# Altium footprint library ABSDataSystem_PartsLibrary.PcbLib: 50 footprints (part 2 of 4)
Each footprint in its own frame and in the unit in brackets; x right, y up, seen from the top. Pads: shape width x height; smd on the part's side, far side on the other; paste and mask are expansions set on the pad; w line width, h text height; cw(c..) or ccw(c..) is an arc to the next point about the centre after c.
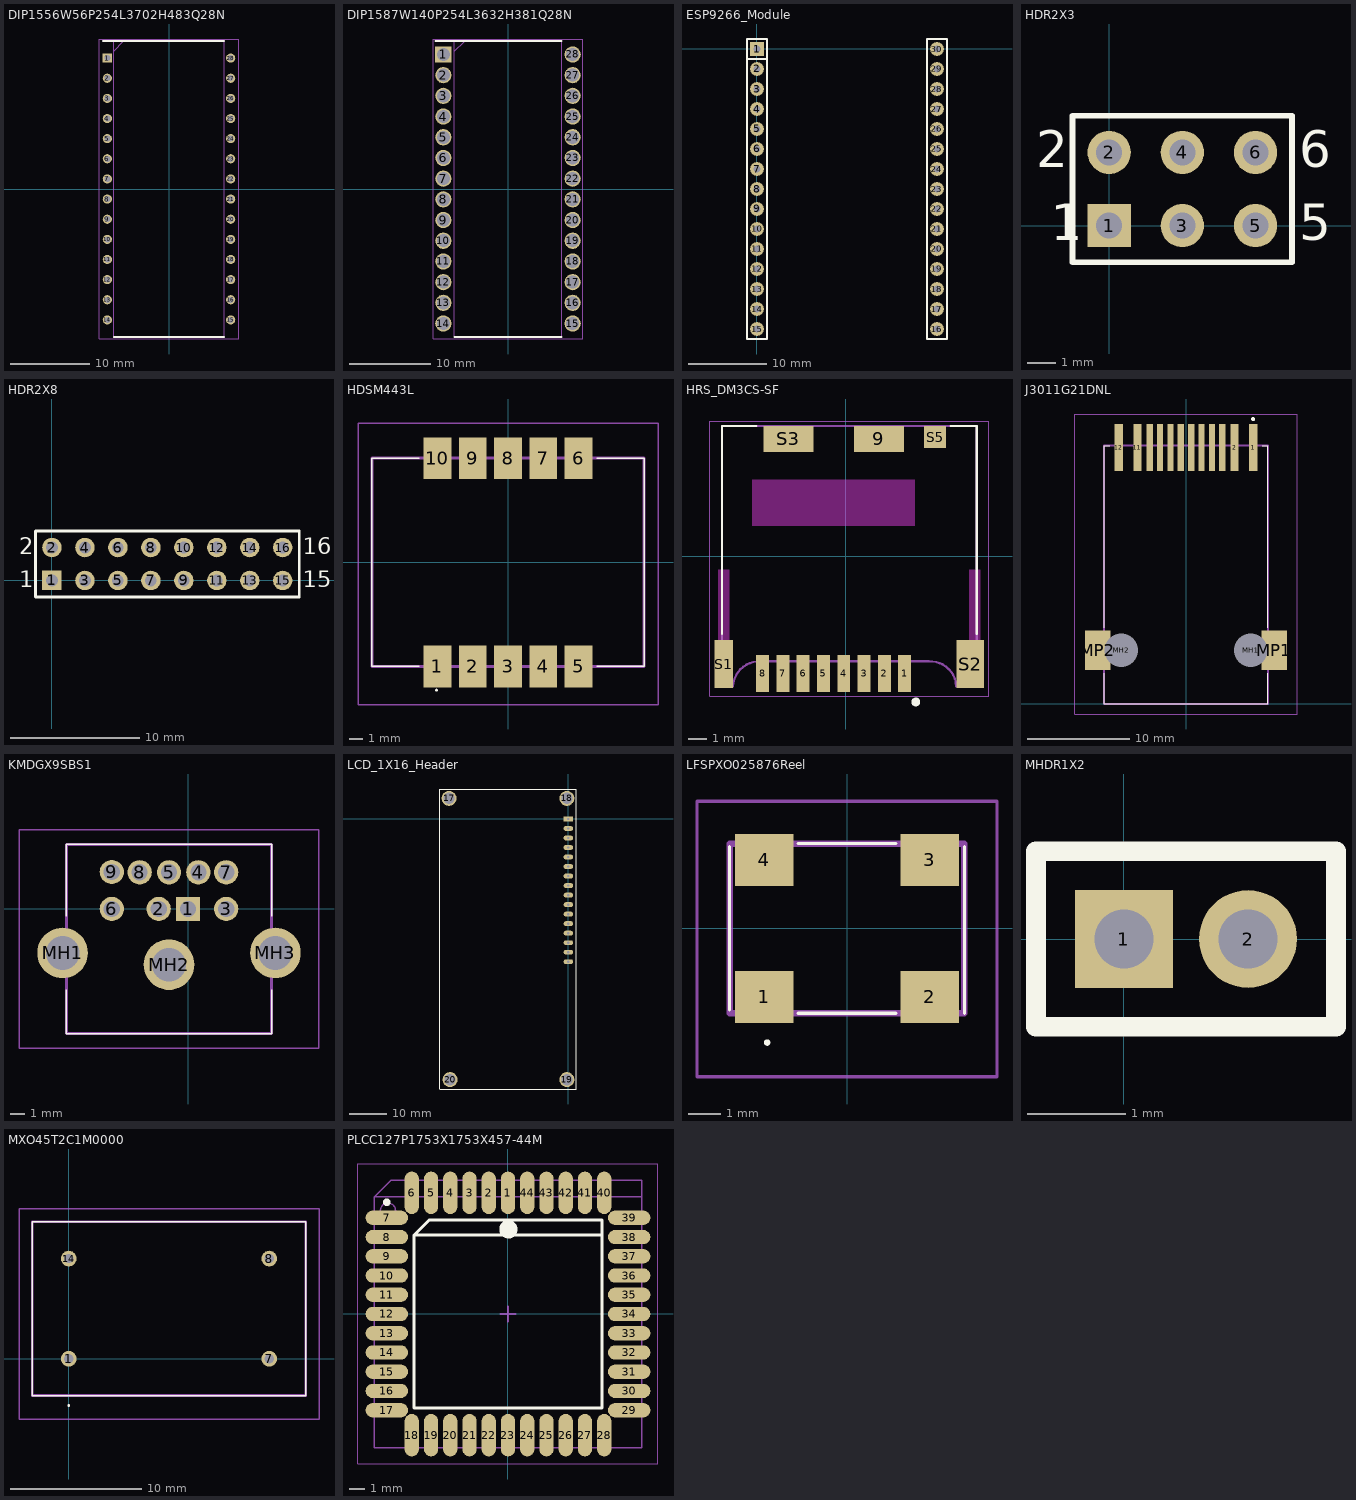
[diagram p1: the footprints below, top view; thin cyan lines are the x and y axes]

## DIP1556W56P254L3702H483Q28N [mm]
pads (28):
  rect 1.159x1.159 hole 0.759: 1(-7.779,16.51)
  round 1.159 hole 0.759: 2(-7.779,13.97) 3(-7.779,11.43) 4(-7.779,8.89) 5(-7.779,6.35) 6(-7.779,3.81) 7(-7.779,1.27) 8(-7.779,-1.27) 9(-7.779,-3.81) 10(-7.779,-6.35) 11(-7.779,-8.89) 12(-7.779,-11.43) 13(-7.779,-13.97) 14(-7.779,-16.51) 15(7.779,-16.51) 16(7.779,-13.97) 17(7.779,-11.43) 18(7.779,-8.89) 19(7.779,-6.35) 20(7.779,-3.81) 21(7.779,-1.27) 22(7.779,1.27) 23(7.779,3.81) 24(7.779,6.35) 25(7.779,8.89) 26(7.779,11.43) 27(7.779,13.97) 28(7.779,16.51)
Top Overlay:
  lines w0.2: -8.358,18.669 6.985,18.669 ; -6.985,-18.669 6.985,-18.669
Mechanical 13:
  lines w0.1: -6.985,17.399 -5.715,18.669 ; -6.985,-18.669 -6.985,18.669 6.985,18.669 6.985,-18.669 -6.985,-18.669
Mechanical 15:
  lines w0.05: -8.767,-18.919 -8.767,18.919 8.767,18.919 8.767,-18.919 -8.767,-18.919
3D body "AT28C256-15PU.stp": height 4.83, standoff -3.5, extent -7.919,-18.51 7.919,18.51

## DIP1587W140P254L3632H381Q28N [mm]
pads (28):
  rect 1.997x1.997 hole 1.597: 1(-7.935,16.51)
  round 1.997 hole 1.597: 2(-7.935,13.97) 3(-7.935,11.43) 4(-7.935,8.89) 5(-7.935,6.35) 6(-7.935,3.81) 7(-7.935,1.27) 8(-7.935,-1.27) 9(-7.935,-3.81) 10(-7.935,-6.35) 11(-7.935,-8.89) 12(-7.935,-11.43) 13(-7.935,-13.97) 14(-7.935,-16.51) 15(7.935,-16.51) 16(7.935,-13.97) 17(7.935,-11.43) 18(7.935,-8.89) 19(7.935,-6.35) 20(7.935,-3.81) 21(7.935,-1.27) 22(7.935,1.27) 23(7.935,3.81) 24(7.935,6.35) 25(7.935,8.89) 26(7.935,11.43) 27(7.935,13.97) 28(7.935,16.51)
Top Overlay:
  lines w0.2: -8.934,18.161 6.604,18.161 ; -6.604,-18.161 6.604,-18.161
Mechanical 13:
  lines w0.1: -6.604,16.891 -5.334,18.161 ; -6.604,-18.161 -6.604,18.161 6.604,18.161 6.604,-18.161 -6.604,-18.161
Mechanical 15:
  lines w0.05: -9.184,-18.411 -9.184,18.411 9.184,18.411 9.184,-18.411 -9.184,-18.411
3D body "AS6C62256-55PCN.stp": height 3.81, standoff -3.5, extent -8.284,-18.161 8.284,18.161

## ESP9266_Module [mil]
pads (30):
  rect 69x69 hole 35: 1(0,0)
  round 69 hole 35: 2(0,-100) 3(0,-200) 4(0,-300) 5(0,-400) 6(0,-500) 7(0,-600) 8(0,-700) 9(0,-800) 10(0,-900) 11(0,-1000) 12(0,-1100) 13(0,-1200) 14(0,-1300) 15(0,-1400) 16(900,-1400) 17(900,-1300) 18(900,-1200) 19(900,-1100) 20(900,-1000) 21(900,-900) 22(900,-800) 23(900,-700) 24(900,-600) 25(900,-500) 26(900,-400) 27(900,-300) 28(900,-200) 29(900,-100) 30(900,0)
Top Overlay:
  lines w7.87: -50,-50 50,-50 ; -50,-1450 -50,50 50,50 50,-1450 -50,-1450 ; 850,-1450 850,50 950,50 950,-1450 850,-1450
3D body "User Library-Male-Pin Header Strip-1x1-2.54mm.step": height 335, standoff -145, extent 842.52,-750 957.48,-650
3D body "User Library-Male-Pin Header Strip-1x1-2.54mm.step": height 335, standoff -145, extent 842.52,-850 957.48,-750
3D body "User Library-Male-Pin Header Strip-1x1-2.54mm.step": height 335, standoff -145, extent 842.52,-950 957.48,-850
3D body "User Library-Male-Pin Header Strip-1x1-2.54mm.step": height 335, standoff -145, extent 842.52,-650 957.48,-550
3D body "User Library-Male-Pin Header Strip-1x1-2.54mm.step": height 335, standoff -145, extent 842.52,-550 957.48,-450
3D body "User Library-Male-Pin Header Strip-1x1-2.54mm.step": height 335, standoff -145, extent 842.52,-250 957.48,-150
3D body "User Library-Male-Pin Header Strip-1x1-2.54mm.step": height 335, standoff -145, extent 842.52,-350 957.48,-250
3D body "User Library-Male-Pin Header Strip-1x1-2.54mm.step": height 335, standoff -145, extent 842.52,-450 957.48,-350
3D body "User Library-Male-Pin Header Strip-1x1-2.54mm.step": height 335, standoff -145, extent 842.52,-150 957.48,-50
3D body "User Library-Male-Pin Header Strip-1x1-2.54mm.step": height 335, standoff -145, extent 842.52,-50 957.48,50
3D body "User Library-Male-Pin Header Strip-1x1-2.54mm.step": height 335, standoff -145, extent 842.52,-1050 957.48,-950
3D body "User Library-Male-Pin Header Strip-1x1-2.54mm.step": height 335, standoff -145, extent 842.52,-1350 957.48,-1250
3D body "User Library-Male-Pin Header Strip-1x1-2.54mm.step": height 335, standoff -145, extent 842.52,-1250 957.48,-1150
3D body "User Library-Male-Pin Header Strip-1x1-2.54mm.step": height 335, standoff -145, extent 842.52,-1150 957.48,-1050
3D body "User Library-Male-Pin Header Strip-1x1-2.54mm.step": height 335, standoff -145, extent 842.52,-1450 957.48,-1350
3D body "User Library-Male-Pin Header Strip-1x1-2.54mm.step": height 335, standoff -145, extent -57.48,-750 57.48,-650
3D body "User Library-Male-Pin Header Strip-1x1-2.54mm.step": height 335, standoff -145, extent -57.48,-850 57.48,-750
3D body "User Library-Male-Pin Header Strip-1x1-2.54mm.step": height 335, standoff -145, extent -57.48,-950 57.48,-850
3D body "User Library-Male-Pin Header Strip-1x1-2.54mm.step": height 335, standoff -145, extent -57.48,-650 57.48,-550
3D body "User Library-Male-Pin Header Strip-1x1-2.54mm.step": height 335, standoff -145, extent -57.48,-550 57.48,-450
3D body "User Library-Male-Pin Header Strip-1x1-2.54mm.step": height 335, standoff -145, extent -57.48,-250 57.48,-150
3D body "User Library-Male-Pin Header Strip-1x1-2.54mm.step": height 335, standoff -145, extent -57.48,-350 57.48,-250
3D body "User Library-Male-Pin Header Strip-1x1-2.54mm.step": height 335, standoff -145, extent -57.48,-450 57.48,-350
3D body "User Library-Male-Pin Header Strip-1x1-2.54mm.step": height 335, standoff -145, extent -57.48,-150 57.48,-50
3D body "User Library-Male-Pin Header Strip-1x1-2.54mm.step": height 335, standoff -145, extent -57.48,-50 57.48,50
3D body "User Library-Male-Pin Header Strip-1x1-2.54mm.step": height 335, standoff -145, extent -57.48,-1050 57.48,-950
3D body "User Library-Male-Pin Header Strip-1x1-2.54mm.step": height 335, standoff -145, extent -57.48,-1350 57.48,-1250
3D body "User Library-Male-Pin Header Strip-1x1-2.54mm.step": height 335, standoff -145, extent -57.48,-1250 57.48,-1150
3D body "User Library-Male-Pin Header Strip-1x1-2.54mm.step": height 335, standoff -145, extent -57.48,-1150 57.48,-1050
3D body "User Library-Male-Pin Header Strip-1x1-2.54mm.step": height 335, standoff -145, extent -57.48,-1450 57.48,-1350

## HDR2X3 [mm] "Connector; Header; 3x2 Position"
pads (6):
  rect 1.5x1.5 hole 0.9: 1(0,0)
  round 1.5 hole 0.9: 2(0,2.54) 3(2.54,0) 4(2.54,2.54) 5(5.08,0) 6(5.08,2.54)
Top Overlay:
  lines w0.2: 1.482,-1.27 6.35,-1.27 ; 6.35,-1.27 -1.27,-1.27 -1.27,3.81 6.35,3.81 6.35,-1.27
  text "1" at -2.032,-0.508 h1.27
  text "2" at -2.54,2.032 h1.27
  text "5" at 6.604,-0.508 h1.27
  text "6" at 6.604,2.032 h1.27

## HDR2X8 [mm] "Connector; Header; 8x2 Position"
pads (16):
  rect 1.5x1.5 hole 0.9: 1(0,0)
  round 1.5 hole 0.9: 2(0,2.54) 3(2.54,0) 4(2.54,2.54) 5(5.08,0) 6(5.08,2.54) 7(7.62,0) 8(7.62,2.54) 9(10.16,0) 10(10.16,2.54) 11(12.7,0) 12(12.7,2.54) 13(15.24,0) 14(15.24,2.54) 15(17.78,0) 16(17.78,2.54)
Top Overlay:
  lines w0.2: -1.27,-1.27 -1.27,3.81 19.05,3.81 19.05,-1.27 -1.27,-1.27
  text "2" at -2.54,2.032 h1.27
  text "1" at -2.54,-0.508 h1.27
  text "15" at 19.304,-0.508 h1.27
  text "16" at 19.304,2.032 h1.27

## HDSM443L [mm]
pads (10):
  rect 2x3 smd: 1(-5.08,-7.5) 2(-2.54,-7.5) 3(0,-7.5) 4(2.54,-7.5) 5(5.08,-7.5) 6(5.08,7.5) 7(2.54,7.5) 8(0,7.5) 9(-2.54,7.5) 10(-5.08,7.5)
Top Overlay:
  lines w0.1: -6.4,-7.5 -9.8,-7.5 -9.8,7.5 -6.4,7.5 ; 6.4,-7.5 9.8,-7.5 9.8,7.5 6.4,7.5 ; -5.2,-9.2 cw(c-5.15,-9.2) -5.1,-9.2 cw(c-5.15,-9.2) -5.2,-9.2
Mechanical 13:
  lines w0.2: -9.8,-7.5 -9.8,7.5 9.8,7.5 9.8,-7.5 -9.8,-7.5
Mechanical 15:
  lines w0.1: -10.8,-10.25 -10.8,10 10.8,10 10.8,-10.25 -10.8,-10.25
3D body "HDSM-443L.stp": height 4.1, standoff 0, extent -9.8,-8.8 9.8,8.8

## HRS_DM3CS-SF [mm]
pads (13):
  rect 0.7x2 smd: 1(3.2,-6.35) 2(2.1,-6.35) 3(1,-6.35) 4(-0.1,-6.35) 5(-1.2,-6.35) 6(-2.3,-6.35) 7(-3.4,-6.35) 8(-4.5,-6.35)
  rect 2.7x1.4 smd: 9(1.8,6.35) S3(-3.1,6.35)
  rect 1x2.6 smd: S1(-6.6,-5.85)
  rect 1.5x2.6 smd: S2(6.75,-5.85)
  rect 1.2x1.2 smd: S5(4.85,6.45)
Top Overlay:
  circle w0.24: c3.8,-7.9 r0.12
  lines w0.127: -6.7,-4.2 -6.7,7.05 -4.826,7.05 ; 5.7,7.05 7.1,7.05 7.1,-4.2
Keep-Out Layer:
  region: 7.3,-4.558 6.712,-4.558 6.712,-0.75 7.3,-0.75
  region: -6.3,-4.558 -6.912,-4.558 -6.912,-0.75 -6.3,-0.75
  region: 7.3,-4.556 6.709,-4.556 6.709,-0.75 7.3,-0.75
  region: -6.3,-4.558 -6.912,-4.558 -6.912,-0.75 -6.3,-0.75
  region: 3.75,1.651 -5.053,1.651 -5.053,4.15 3.75,4.15
  region: 3.75,1.65 -5.051,1.65 -5.051,4.15 3.75,4.15
Mechanical 13:
  lines w0.127: 4.5,-5.7 -4.6,-5.7 ccw(c-4.675,-7.125) -6.1,-7.05 -6.7,-7.05 -6.7,7.05 7.1,7.05 7.1,-7.05 6,-7.05 ccw(c4.575,-7.125) 4.5,-5.7
Mechanical 15:
  lines w0.05: -7.35,-7.6 7.75,-7.6 7.75,7.3 -7.35,7.3 -7.35,-7.6

## J3011G21DNL [mm]
pads (16):
  rect 0.81x4.6 smd: 1(6.61,25.2) 2(4.77,25.2) 11(-4.77,25.2) 12(-6.61,25.2)
  rect 0.61x4.6 smd: 3(3.57,25.2) 4(2.55,25.2) 5(1.53,25.2) 6(0.51,25.2) 7(-0.51,25.2) 8(-1.53,25.2) 9(-2.55,25.2) 10(-3.57,25.2)
  round 1.65 hole 3.3 unplated: MH1(6.35,5.28) MH2(-6.35,5.28)
  rect 2.5x3.9 smd: MP1(8.67,5.28) MP2(-8.67,5.28)
Top Overlay:
  lines w0.1: -8.05,3 -8.05,0 8,0 8.05,0 8.05,3 ; -8.05,7.5 -8.05,25.4 -7.5,25.4 ; 7.5,25.4 8.05,25.4 8.05,7.5
  lines w0.2: 6.5,28 ccw(c6.6,28) 6.7,28 ccw(c6.6,28) 6.5,28
Mechanical 13:
  lines w0.2: -8.05,0 8.05,0 8.05,25.4 -8.05,25.4 -8.05,0
Mechanical 15:
  lines w0.1: -10.92,-1 10.92,-1 10.92,28.5 -10.92,28.5 -10.92,-1

## KMDGX9SBS1 [mm]
pads (12):
  rect 1.65x1.65 hole 1.1: 1(0,0)
  round 1.65 hole 1.1: 2(-2,0) 3(2.6,0) 4(0.7,2.5) 5(-1.3,2.5) 6(-5.2,0) 7(2.6,2.5) 8(-3.3,2.5) 9(-5.2,2.52)
  round 3.45 hole 2.3: MH1(-8.55,-3) MH2(-1.3,-3.8) MH3(5.95,-3)
Top Overlay:
  lines w0.1: -8.3,-5.5 -8.3,-8.5 5.7,-8.5 5.7,-5.5 ; -8.3,-0.5 -8.3,4.4 5.7,4.4 5.7,-0.5
Mechanical 13:
  lines w0.2: -8.3,-8.5 5.7,-8.5 5.7,4.4 -8.3,4.4 -8.3,-8.5
Mechanical 15:
  lines w0.1: -11.525,-9.5 8.925,-9.5 8.925,5.4 -11.525,5.4 -11.525,-9.5
3D body "KMDGX-9S-BS-1.stp": height 13.1, standoff -5, extent -9.592,-8.5 7,4.4

## LCD_1X16_Header [mm]
pads (20):
  rect 2.54x1.27 hole 0.635: 1(0,0)
  oval 2.54x1.27 hole 0.635: 2(0,-2.54) 3(0,-5.08) 4(0,-7.62) 5(0,-10.16) 6(0,-12.7) 7(0,-15.24) 8(0,-17.78) 9(0,-20.32) 10(0,-22.86) 11(0,-25.4) 12(0,-27.94) 13(0,-30.48) 14(0,-33.02) 15(0,-35.56) 16(0,-38.1)
  round 4 hole 3: 17(-31.866,5.5) 18(-0.396,5.5) 19(-0.396,-69.6) 20(-31.572,-69.6)
Top Overlay:
  lines w0.254: -34.366,-72.1 2.134,-72.1 2.134,8 -34.366,8 -32.232,8 ; -34.366,-72.093 -34.366,0 -34.366,8.001

## LFSPXO025876Reel [mm]
pads (4):
  rect 1.8x1.6 smd: 1(-2.54,-2.1) 2(2.54,-2.1) 3(2.54,2.1) 4(-2.54,2.1)
Top Overlay:
  lines w0.1: -3.6,-2.5 -3.6,2.5 ; -1.5,-2.6 1.5,-2.6 ; -1.5,2.6 1.5,2.6 ; 3.6,-2.6 3.6,2.5 ; -2.5,-3.5 cw(c-2.45,-3.5) -2.4,-3.5 cw(c-2.45,-3.5) -2.5,-3.5
Mechanical 13:
  lines w0.2: -3.6,-2.6 -3.6,2.6 3.6,2.6 3.6,-2.6 -3.6,-2.6
Mechanical 15:
  lines w0.1: -4.6,-4.55 -4.6,3.9 4.6,3.9 4.6,-4.55 -4.6,-4.55
3D body "LFSPXO025876Reel.stp": height 1.5, standoff 0, extent -3.6,-2.74 3.6,2.74

## MHDR1X2 [mm] "Connector; Header; 2 Position"
pads (2):
  rect 1x1 hole 0.6: 1(0,0)
  round 1 hole 0.6: 2(1.27,0)
Top Overlay:
  lines w0.2: -0.9,-0.9 -0.9,0.9 2.17,0.9 2.17,-0.9 -0.9,-0.9

## MXO45T2C1M0000 [mm]
pads (4):
  round 1.192 hole 0.7: 1(0,0) 7(15.24,0) 8(15.24,7.62) 14(0,7.62)
Top Overlay:
  lines w0.1: -2.78,-2.79 18.02,-2.79 18.02,10.41 -2.78,10.41 -2.78,-2.79 ; 0,-3.6 cw(c0,-3.55) 0,-3.5 cw(c0,-3.55) 0,-3.6
Mechanical 13:
  lines w0.2: -2.78,-2.79 18.02,-2.79 18.02,10.41 -2.78,10.41 -2.78,-2.79
Mechanical 15:
  lines w0.1: -3.78,-4.6 19.02,-4.6 19.02,11.41 -3.78,11.41 -3.78,-4.6
3D body "MXO45T-2C-1M0000.stp": height 6.2, standoff -5, extent -2.78,-2.79 18.02,10.41

## PCBComponent_1 - duplicate [mm]

## PLCC127P1753X1753X457-44M [mm] "Leaded Chip Carrier, 44-Leads, Body 17.53x17.53mm, Pitch 1.270mm, IPC Low Density"
height 4.58
pads (44):
  oval 0.95x2.8 smd: 1(0,8) 2(-1.27,8) 3(-2.54,8) 4(-3.81,8) 5(-5.08,8) 6(-6.35,8) 18(-6.35,-8) 19(-5.08,-8) 20(-3.81,-8) 21(-2.54,-8) 22(-1.27,-8) 23(0,-8) 24(1.27,-8) 25(2.54,-8) 26(3.81,-8) 27(5.08,-8) 28(6.35,-8) 40(6.35,8) 41(5.08,8) 42(3.81,8) 43(2.54,8) 44(1.27,8)
  oval 2.8x0.95 smd: 7(-8,6.35) 8(-8,5.08) 9(-8,3.81) 10(-8,2.54) 11(-8,1.27) 12(-8,0) 13(-8,-1.27) 14(-8,-2.54) 15(-8,-3.81) 16(-8,-5.08) 17(-8,-6.35) 29(8,-6.35) 30(8,-5.08) 31(8,-3.81) 32(8,-2.54) 33(8,-1.27) 34(8,0) 35(8,1.27) 36(8,2.54) 37(8,3.81) 38(8,5.08) 39(8,6.35)
Top Overlay:
  circle w0.25: c-8,7.375 r0.125
  circle w0.6: c0.025,5.588 r0.3
  lines w0.2: 6.2,5.2 -6.2,5.2 ; -6.2,5.2 -5.2,6.2 6.2,6.2 6.2,-6.2 -6.2,-6.2 -6.2,5.2
Mechanical 13:
  circle w0.1: c-7.925,6.825 r0.5
  lines w0.1: 8.825,7.725 -8.825,7.725 ; -8.825,7.725 -8.825,-8.825 8.825,-8.825 8.825,8.825 -7.725,8.825 -8.825,7.725
Mechanical 15:
  lines w0.05: -9.9,-9.9 -9.9,9.9 9.9,9.9 9.9,-9.9 -9.9,-9.9
  lines w0.1: -0.5,0 0.5,0 ; 0,-0.5 0,0.5
3D body "PLCC127P1753X1753X457-44M.step": height 4.57, standoff 2.29, extent -8.825,-8.825 8.825,8.825

## PLCC-44 [mm]